# Altium footprint library LimeMicroAltiumLib_pcbLib_r05.PcbLib: 746 footprints (part 39 of 48)
Each footprint in its own frame and in the unit in brackets; x right, y up, seen from the top. Pads: shape width x height; smd on the part's side, far side on the other; paste and mask are expansions set on the pad; w line width, h text height; cw(c..) or ccw(c..) is an arc to the next point about the centre after c.
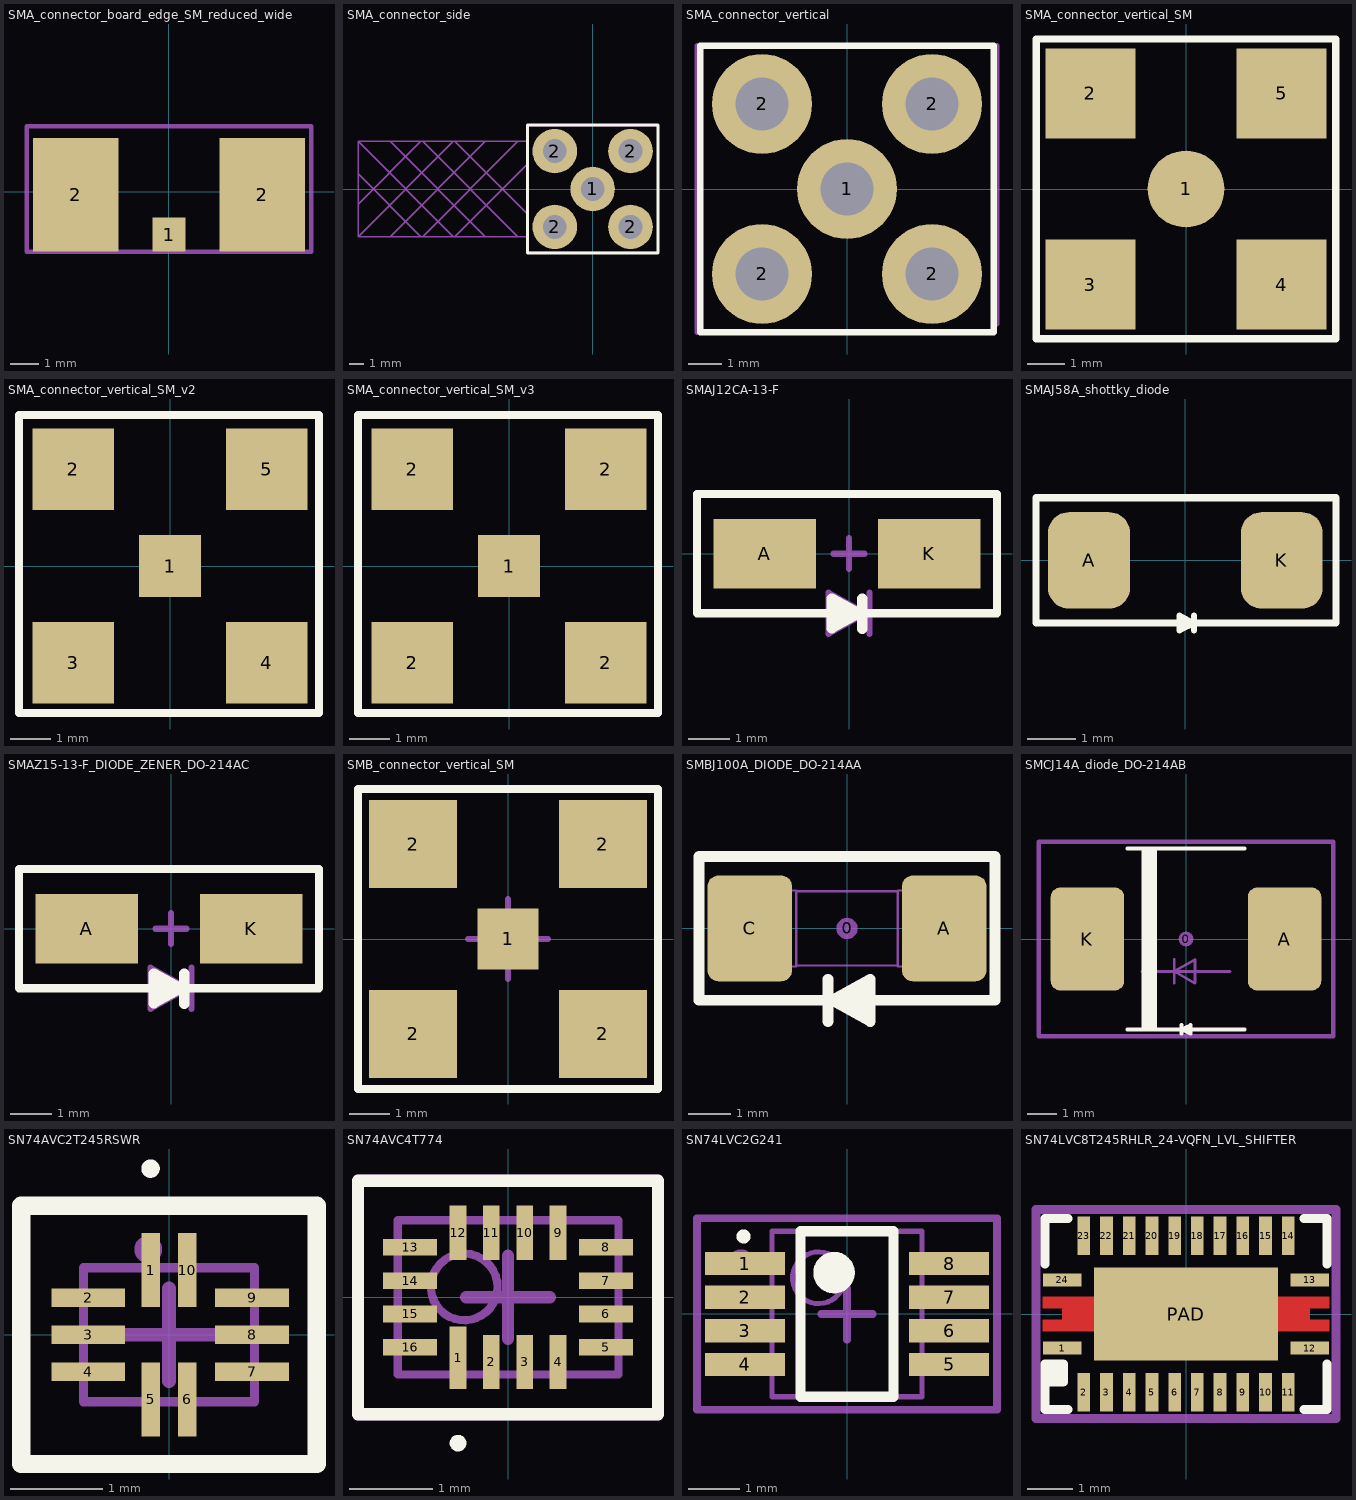
[diagram p38: the footprints below, top view; thin cyan lines are the x and y axes]

## SMA_connector_board_edge_SM_reduced_wide [mm]
pads (3):
  rect 1.15x1.2 smd: 1(0,-1.5)
  rect 3x4 smd: 2(-3.27,-0.1) 2(3.27,-0.1)
Mechanical 15:
  lines w0.15: -5,-2.1 5,-2.1 5,2.3 -5,2.3 -5,-2.1
  text ".Designator" at 0,0 h0.55
  text "PCB edge" at -2.2,-2.1 h0.55
3D body "142-0701-841.stp": height 4.06, standoff -3.86, extent -4.762,-12.525 4.763,1.75

## SMA_connector_side [mm]
pads (5):
  round 3 hole 1.6: 1(0,0) 2(-2.55,-2.55) 2(-2.55,2.55) 2(2.55,-2.55) 2(2.55,2.55)
Top Overlay:
  lines w0.2: -4.4,-4.3 -4.4,4.3 4.4,4.3 4.4,-4.3 -4.4,-4.3
Mechanical 15:
  lines w0.1: -15.8,-1.025 -11.575,3.2 ; -15.8,1.025 -11.575,-3.2 ; -13.625,-3.2 -7.225,3.2 ; -13.625,3.2 -7.225,-3.2 ; -11.45,-3.2 -5.05,3.2 ; -11.45,3.2 -5.05,-3.2 ; -9.4,-3.2 -15.8,3.2 ; -9.4,3.2 -15.8,-3.2 ; -9.275,-3.2 -4.4,1.675 ; -9.275,3.2 -4.4,-1.675 ; -4.4,-3.2 -15.8,-3.2 ; -4.4,3.2 -15.8,3.2 ; -15.8,-3.2 -15.8,3.2
  lines w0.15: -4.25,-4.3 4.25,-4.3 ; -0.5,0 0,0 ; 0,-0.5 0,0 ; 0,0.5 0,0 ; 0.5,0 0,0 ; -4.4,-4.3 -4.4,4.3 4.4,4.3 4.4,-4.3 -4.4,-4.3
  text "Connector out" at -1.7,-3.35 h0.8
  text ".Designator" at 0,0 h0.55
3D body "User Library-SMA-RIGHTANGLE-TE.step": height 9.6, standoff -3.9, extent -15.8,-3.2 3.2,3.2

## SMA_connector_vertical [mm]
pads (5):
  round 3 hole 1.6: 1(0,0) 2(-2.55,-2.55) 2(-2.55,2.55) 2(2.55,-2.55) 2(2.55,2.55)
Top Overlay:
  lines w0.2: -4.4,-4.3 -4.4,4.3 4.4,4.3 4.4,-4.3 -4.4,-4.3
Mechanical 15:
  lines w0.15: -4.25,-4.3 4.25,-4.3 -4.5,-4.3 -4.5,4.3 4.5,4.3 4.5,-4.05 4.5,4 ; -0.5,0 0,0 ; 0,-0.5 0,0 ; 0,0.5 0,0 ; 0.5,0 0,0
  text ".Designator" at 0,0 h0.55
3D body "User Library-SMA_Stehend_Amp 132134RP-1.STEP": height 9.53, standoff -3.94, extent -3.5,-3.5 3.5,3.5

## SMA_connector_vertical_SM [mm]
pads (5):
  round 2.05 smd: 1(0,0)
  rect 2.4x2.4 smd: 2(-2.55,2.55) 3(-2.55,-2.55) 4(2.55,-2.55) 5(2.55,2.55)
Top Overlay:
  lines w0.2: -4,-4 4,-4 4,4 -4,4 -4,-4
Mechanical 15:
  lines w0.15: -0.5,0 0,0 ; 0,-0.5 0,0 ; 0,0.5 0,0 ; 0.5,0 0,0 ; 4,3.95 4,-4 -4,-4 -4,4 ; -4,4 3.95,4 -4,4
  text ".Designator" at 0,0 h0.55
3D body "User Library-Con, 142-0711-201.STEP": height 8.84, standoff 0, extent -3.233,-3.233 3.234,3.234

## SMA_connector_vertical_SM_v2 [mm]
pads (5):
  rect 1.52x1.52 smd: 1(0,0)
  rect 2x2 smd: 2(-2.37,2.37) 3(-2.37,-2.37) 4(2.37,-2.37) 5(2.37,2.37)
Top Overlay:
  lines w0.2: -3.7,-3.6 3.65,-3.6 3.65,3.7 -3.7,3.7 -3.7,-3.6
Mechanical 15:
  lines w0.15: -0.5,0 0,0 ; 0,-0.5 0,0 ; 0,0.5 0,0 ; 0.5,0 0,0 ; -3.7,-3.6 -3.7,3.7 3.65,3.7 3.65,-3.6 -3.7,-3.6
  text ".Designator" at 0,0 h0.55
3D body "User Library-Con, 142-0711-201.STEP": height 8.84, standoff 0, extent -3.233,-3.233 3.234,3.234

## SMA_connector_vertical_SM_v3 [mm]
pads (5):
  rect 1.52x1.52 smd: 1(0,0)
  rect 2x2 smd: 2(-2.37,-2.37) 2(-2.37,2.37) 2(2.37,-2.37) 2(2.37,2.37)
Top Overlay:
  lines w0.2: -3.7,-3.6 -3.7,3.7 3.65,3.7 3.65,-3.6 -3.7,-3.6
Mechanical 15:
  lines w0.15: -0.5,0 0,0 ; 0,-0.5 0,0 ; 0,0.5 0,0 ; 0.5,0 0,0 ; -3.7,-3.6 3.65,-3.6 3.65,3.7 -3.7,3.7 -3.7,-3.6
  text ".Designator" at 0,0 h0.55
3D body "User Library-Con, 142-0711-201.STEP": height 8.84, standoff 0, extent -3.233,-3.233 3.234,3.234

## SMAJ12CA-13-F [mm]
pads (2):
  rect 2.5x1.7 smd: A(-2.05,0) K(1.95,0)
Top Overlay:
  lines w0.2: -3.7,-1.45 3.6,-1.45 3.6,1.45 -3.7,1.45 -3.7,-1.45
  lines w0.254: -0.475,-1.45 0.225,-1.45 ; -0.275,-1.55 -0.275,-1.35 ; 0.325,-1.825 0.325,-1.1 ; 0.225,-1.45 -0.425,-1.089 -0.425,-1.811 0.225,-1.45
Mechanical 15:
  lines w0.15: -0.5,-1.45 -0.3,-1.45 0.4,-1.45 ; -0.375,0 0,0 ; 0,-0.375 0,0 ; 0,0.375 0,0 ; 0.375,0 0,0 ; 0.5,-1.95 0.5,-0.95 ; 0.4,-1.45 -0.5,-1.95 -0.5,-0.95 0.4,-1.45 ; -3.7,-1.45 -3.7,1.45 3.6,1.45 3.6,-1.45 -3.7,-1.45
  text "A" at -2.375,-0.3 h0.55
  text "C" at 2.15,-0.3 h0.55
  text ".Designator" at 0,0 h0.55
3D body "User Library-Diode Molded Body.step": height 1.79, standoff -1.13, extent -2.65,-1.3 2.65,1.3

## SMAJ58A_shottky_diode [mm]
pads (2):
  rrect50% 1.7x2 smd mask+0.05: A(-2,0) K(2,0)
Top Overlay:
  lines w0.127: -0.125,-1.3 0.175,-1.3 ; 0.175,-1.45 0.175,-1.15 ; 0.175,-1.3 -0.125,-1.45 -0.125,-1.15 0.175,-1.3
  lines w0.15: -3.1,-1.3 3.125,-1.3 3.125,1.3 -3.1,1.3 -3.1,-1.3
Mechanical 15:
  text "A" at -2.4,-0.5 h0.55
  text ".Designator" at -0.1,-0.3 h0.55
3D body "User Library-Diode Molded Body.step": height 2.89, standoff -0.03, extent -2.65,-1.3 2.65,1.3

## SMAZ15-13-F_DIODE_ZENER_DO-214AC [mm]
pads (2):
  rect 2.5x1.7 smd: A(-2.05,0) K(1.95,0)
Top Overlay:
  lines w0.2: -3.7,-1.45 3.6,-1.45 3.6,1.45 -3.7,1.45 -3.7,-1.45
  lines w0.254: -0.475,-1.45 0.225,-1.45 ; -0.275,-1.55 -0.275,-1.35 ; 0.325,-1.825 0.325,-1.1 ; 0.225,-1.45 -0.425,-1.089 -0.425,-1.811 0.225,-1.45
Mechanical 15:
  lines w0.15: -0.5,-1.45 -0.3,-1.45 0.4,-1.45 ; -0.375,0 0,0 ; 0,-0.375 0,0 ; 0,0.375 0,0 ; 0.375,0 0,0 ; 0.5,-1.95 0.5,-0.95 ; 0.4,-1.45 -0.5,-1.95 -0.5,-0.95 0.4,-1.45 ; -3.7,-1.45 -3.7,1.45 3.6,1.45 3.6,-1.45 -3.7,-1.45
  text "A" at -2.375,-0.3 h0.55
  text "C" at 2.15,-0.3 h0.55
  text ".Designator" at 0,0 h0.55
3D body "User Library-Diode Molded Body.step": height 1.79, standoff -1.13, extent -2.65,-1.3 2.65,1.3

## SMB_connector_vertical_SM [mm]
pads (5):
  rect 1.52x1.52 smd: 1(0,0)
  rect 2.2x2.2 smd: 2(-2.37,-2.37) 2(-2.37,2.37) 2(2.37,-2.37) 2(2.37,2.37)
Top Overlay:
  lines w0.2: -3.75,-3.75 3.75,-3.75 3.75,3.75 -3.75,3.75 -3.75,-3.75
Mechanical 15:
  lines w0.15: -1,0 0,0 ; 0,-1 0,0 ; 0,1 0,0 ; 1,0 0,0 ; -3.75,-3.75 -3.75,3.75 3.75,3.75 3.75,-3.75 -3.75,-3.75
  text ".Designator" at 0,0 h0.55
3D body "User Library-c-1-1337604-0-d.STEP": height 7.65, standoff -0.05, extent -3.175,-3.175 3.175,3.175

## SMBJ100A_DIODE_DO-214AA [mm]
pads (3):
  round 0.508 on Mech15: 0(0,0)
  rrect25% 2x2.5 smd: A(2.3,0) C(-2.3,0)
Top Overlay:
  lines w0.254: -0.45,-2.2 -0.45,-1.2 ; 0.05,-1.9 0.55,-1.9 ; 0.15,-1.5 0.55,-1.5 ; 0.55,-1.7 0.35,-1.7 -0.35,-1.7 ; -0.35,-1.7 0.55,-1.2 0.55,-2.2 -0.35,-1.7 ; -3.5,-1.7 3.5,-1.7 3.5,1.7 -3.5,1.7 -3.5,-1.7
Mechanical 13:
  lines w0.05: -1.2,-0.88 1.2,-0.88 ; -1.2,0.88 1.2,0.88 ; -1.7,-0.9 -1.2,-0.9 -1.2,0.9 -1.7,0.9 -1.7,-0.9 ; 1.2,-0.9 1.7,-0.9 1.7,0.9 1.2,0.9 1.2,-0.9
Mechanical 15:
  lines w0.15: -0.45,-2.2 -0.45,-1.2 ; 0.05,-1.9 0.55,-1.9 ; 0.15,-1.5 0.55,-1.5 ; 0.55,-1.7 0.35,-1.7 -0.35,-1.7 ; -0.35,-1.7 0.55,-2.2 0.55,-1.2 -0.35,-1.7 ; -3.5,-1.7 -3.5,1.7 3.5,1.7 3.5,-1.7 -3.5,-1.7
  text ".Designator" at 0,0 h0.55
  text "C" at -2.2,-0.5 h0.55
  text "A" at 1.7,-0.5 h0.55
3D body "User Library-DO-214AA SMB.step": height 2.3, standoff 0, extent -2.7,-1.8 2.7,1.8

## SMCJ14A_diode_DO-214AB [mm]
height 1.15
pads (3):
  round 0.508 on Mech15: 0(0,0)
  rrect25% 2.5x3.5 smd: A(3.35,0) K(-3.35,0)
Top Overlay:
  region: -1.5,-3.075 -1.5,3.075 -1,3.075 -1,-3.075
  lines w0.127: -2,-3.075 2,-3.075 ; -2,3.075 2,3.075 ; -0.15,-3.225 -0.15,-2.925 ; 0.15,-3.075 -0.15,-3.075 ; -0.15,-3.075 0.15,-3.225 0.15,-2.925 -0.15,-3.075
Mechanical 15:
  lines w0.1: -1.5,-1.1 1.5,-1.1 ; -0.4,-1.5 -0.4,-0.7 ; -0.4,-1.1 0.3,-1.5 0.3,-0.7 -0.4,-1.1
  lines w0.15: -5,-3.3 5,-3.3 5,3.3 -5,3.3 -5,-3.3
  text "A" at 3.175,-0.275 h0.55
  text "K" at -3.9,-0.275 h0.55
  text ".Designator" at 0,0 h0.55
3D body "User Library-DO-214AB SMC.step": height 2.3, standoff 0, extent -3.975,-2.95 3.975,2.95

## SN74AVC2T245RSWR [mm] "PQFN, 10-Leads, Body 1,80x1,40mm, Pitch 0,40mm, IPC Medium Density"
height 0.55
pads (10):
  rect 0.2x0.8 smd: 1(-0.2,0.7) 5(-0.2,-0.7) 6(0.2,-0.7) 10(0.2,0.7)
  rect 0.8x0.2 smd: 2(-0.875,0.4) 3(-0.875,0) 4(-0.875,-0.4) 7(0.9,-0.4) 8(0.9,0) 9(0.9,0.4)
Top Overlay:
  circle w0.1: c-0.2,1.8 r0.05
  lines w0.2: -1.6,-1.4 -1.6,1.4 1.6,1.4 1.6,-1.4 -1.6,-1.4
Mechanical 13:
  lines w0.1: -0.925,-0.725 -0.925,0.725 0.925,0.725 0.925,-0.725 -0.925,-0.725
Mechanical 15:
  circle w0.2: c-0.225,0.925 r0.05
  lines w0.15: -0.5,0 0.5,0 ; 0,-0.5 0,0.5 ; -1.6,-1.4 -1.6,1.4 1.6,1.4 1.6,-1.4 -1.6,-1.4
  text ".Designator" at 0,0 h0.55
3D body: height 0.55, standoff 0, extent -0.925,-0.725 0.925,0.725

## SN74AVC4T774 [mm] "PQFN, 16-Leads, Body 2,60x1,80mm, Pitch 0,40mm, IPC Medium Density"
height 0.55
pads (16):
  rect 0.2x0.75 smd mask+0.05: 1(-0.6,-0.725)
  rect 0.2x0.65 smd mask+0.05: 2(-0.2,-0.775) 3(0.2,-0.775) 4(0.6,-0.775) 9(0.6,0.775) 10(0.2,0.775) 11(-0.2,0.775) 12(-0.6,0.775)
  rect 0.65x0.2 smd mask+0.05: 5(1.175,-0.6) 6(1.175,-0.2) 7(1.175,0.2) 8(1.175,0.6) 13(-1.175,0.6) 14(-1.175,0.2) 15(-1.175,-0.2) 16(-1.175,-0.6)
Top Overlay:
  circle w0.1: c-0.6,-1.75 r0.05
  lines w0.15: -1.8,-1.4 1.8,-1.4 1.8,1.4 -1.8,1.4 -1.8,-1.4
Top Solder:
  region: 0.8,-0.75 0.45,-0.75 0.45,-0.4 0.8,-0.05
  region: 0.8,0.75 0.45,0.75 0.45,0.4 0.8,0.05
  region: -0.8,0.75 -0.45,0.75 -0.45,0.4 -0.8,0.05
  region: -0.8,-0.75 -0.8,-0.05 -0.45,-0.05 -0.45,-0.75
Mechanical 13:
  circle w0.1: c-0.525,0.125 r0.4
  lines w0.1: -1.325,-0.925 1.325,-0.925 1.325,0.925 -1.325,0.925 -1.325,-0.925
Mechanical 15:
  circle w0.1: c-0.6,-0.975 r0.05
  lines w0.15: -0.5,0 0.5,0 ; 0,-0.5 0,0.5 ; -1.8,-1.4 1.8,-1.4 1.8,1.4 -1.8,1.4 -1.8,-1.4
  text ".Designator" at 0,0 h0.55
3D body "User Library-UQFN-16.step": height 0.55, standoff -0.05, extent -1.325,-0.925 1.325,0.925

## SN74LVC2G241 [mm] "TSOP, 8-Leads, Body 2,95x2,80mm, Pitch 0,65mm, IPC Medium Density"
height 1.3
pads (8):
  rect 1.55x0.45 smd mask+0.05: 1(-1.975,0.975) 2(-1.975,0.325) 3(-1.975,-0.325) 4(-1.975,-0.975) 5(1.975,-0.975) 6(1.975,-0.325) 7(1.975,0.325) 8(1.975,0.975)
Top Overlay:
  circle w0.4: c-0.25,0.8 r0.2
  circle w0.2: c-2,1.5 r0.035
  lines w0.2: -0.9,-1.6 0.9,-1.6 0.9,1.6 -0.9,1.6 -0.9,-1.6
Mechanical 13:
  circle w0.1: c-0.55,0.7 r0.5
  lines w0.1: -1.45,-1.6 1.45,-1.6 1.45,1.6 -1.45,1.6 -1.45,-1.6
Mechanical 15:
  circle w0.35: c-2.05,1 r0.075
  lines w0.15: -0.5,0 0.5,0 ; 0,-0.5 0,0.5 ; -2.9,-1.85 2.9,-1.85 2.9,1.85 -2.9,1.85 -2.9,-1.85
  text ".Designator" at 0,0 h0.55
3D body: height 1.3, standoff 0.1, extent -1.45,-1.6 1.45,1.6

## SN74LVC8T245RHLR_24-VQFN_LVL_SHIFTER [mm]
pads (25):
  rect 0.85x0.28 smd mask+0.05: 1(-2.725,-0.75) 12(2.725,-0.75) 13(2.725,0.75) 24(-2.725,0.75)
  rect 0.28x0.85 smd mask+0.05: 2(-2.25,-1.725) 3(-1.75,-1.725) 4(-1.25,-1.725) 5(-0.75,-1.725) 6(-0.25,-1.725) 7(0.25,-1.725) 8(0.75,-1.725) 9(1.25,-1.725) 10(1.75,-1.725) 11(2.25,-1.725) 14(2.25,1.725) 15(1.75,1.725) 16(1.25,1.725) 17(0.75,1.725) 18(0.25,1.725) 19(-0.25,1.725) 20(-0.75,1.725) 21(-1.25,1.725) 22(-1.75,1.725) 23(-2.25,1.725)
  rect 4.05x2.05 smd paste-4 mask+0.05: PAD(0,0)
Top Layer:
  region: -3.15,0.375 -1.95,0.375 -1.95,0 -2.725,0 -2.725,0.125 -3.15,0.125
  region: -3.15,-0.375 -1.95,-0.375 -1.95,0 -2.725,0 -2.725,-0.125 -3.15,-0.125
  region: 3.15,-0.375 1.95,-0.375 1.95,0 2.725,0 2.725,-0.125 3.15,-0.125
  region: 3.15,0.375 1.95,0.375 1.95,0 2.725,0 2.725,0.125 3.15,0.125
Top Overlay:
  region: -3.1,-1.5 -2.7,-1.5 -2.7,-1.1 -3.1,-1.1
  lines w0.2: -3.1,-1.5 -2.7,-1.5 -2.7,-1.1 -3.1,-1.1 -3.1,-2.1 -2.6,-2.1 ; -3.1,1.1 -3.1,2.1 -2.6,2.1 ; 2.6,-2.1 3.1,-2.1 3.1,-1.1 ; 2.6,2.1 3.1,2.1 3.1,1.1
Top Paste:
  region: 3.15,-0.125 2.175,-0.125 2.175,-0.375 3.15,-0.375
  region: 3.15,0.375 2.175,0.375 2.175,0.125 3.15,0.125
  region: -3.15,0.375 -2.175,0.375 -2.175,0.125 -3.15,0.125
  region: -3.15,-0.125 -2.175,-0.125 -2.175,-0.375 -3.15,-0.375
  region: -1.9,-1
  region: 0,0
  region: 2,0
  region: -0.3,1.1
  region: -1.95,0.15 -1.95,0.95 -0.85,0.95 -0.85,0.15
  region: -1.95,-0.15 -1.95,-0.95 -0.85,-0.95 -0.85,-0.15
  region: -0.55,-0.15 -0.55,-0.95 0.55,-0.95 0.55,-0.15
  region: -0.55,0.15 -0.55,0.95 0.55,0.95 0.55,0.15
  region: 1.95,-0.15 1.95,-0.95 0.85,-0.95 0.85,-0.15
  region: 1.95,0.15 1.95,0.95 0.85,0.95 0.85,0.15
Top Solder:
  region: -3.2,0.425 -1.95,0.425 -1.95,0 -2.775,0 -2.775,0.075 -3.2,0.075
  region: -3.2,-0.425 -1.95,-0.425 -1.95,0 -2.775,0 -2.775,-0.075 -3.2,-0.075
  region: 3.2,-0.425 1.95,-0.425 1.95,0 2.775,0 2.775,-0.075 3.2,-0.075
  region: 3.2,0.425 1.95,0.425 1.95,0 2.775,0 2.775,0.075 3.2,0.075
Mechanical 15:
  lines w0.2: -0.6,0 0,0 ; 0,-0.6 0,0 ; 0,0.6 0,0 ; 0.6,0 0,0 ; -3.3,-2.3 3.3,-2.3 3.3,2.3 -3.3,2.3 -3.3,-2.3
  text ".Designator" at 0,0 h0.55
  text "24" at -3.1,0.3 h0.55
  text "23" at -2.8,1.2 h0.55
  text "14" at 1.8,1.3 h0.55
  text "13" at 2,0.4 h0.55
  text "12" at 2,-1.2 h0.55
  text "11" at 1.9,-2.1 h0.55
  text "2" at -2.5,-2.1 h0.55
  text "1" at -2.8,-1.2 h0.55
3D body "User Library-PVQFN-24.step": height 1.01, standoff -0.01, extent -2.825,-1.825 2.825,1.825